# Altium footprint library mmyLibrary.PcbLib: 231 footprints (part 7 of 15)
Each footprint in its own frame and in the unit in brackets; x right, y up, seen from the top. Pads: shape width x height; smd on the part's side, far side on the other; paste and mask are expansions set on the pad; w line width, h text height; cw(c..) or ccw(c..) is an arc to the next point about the centre after c.
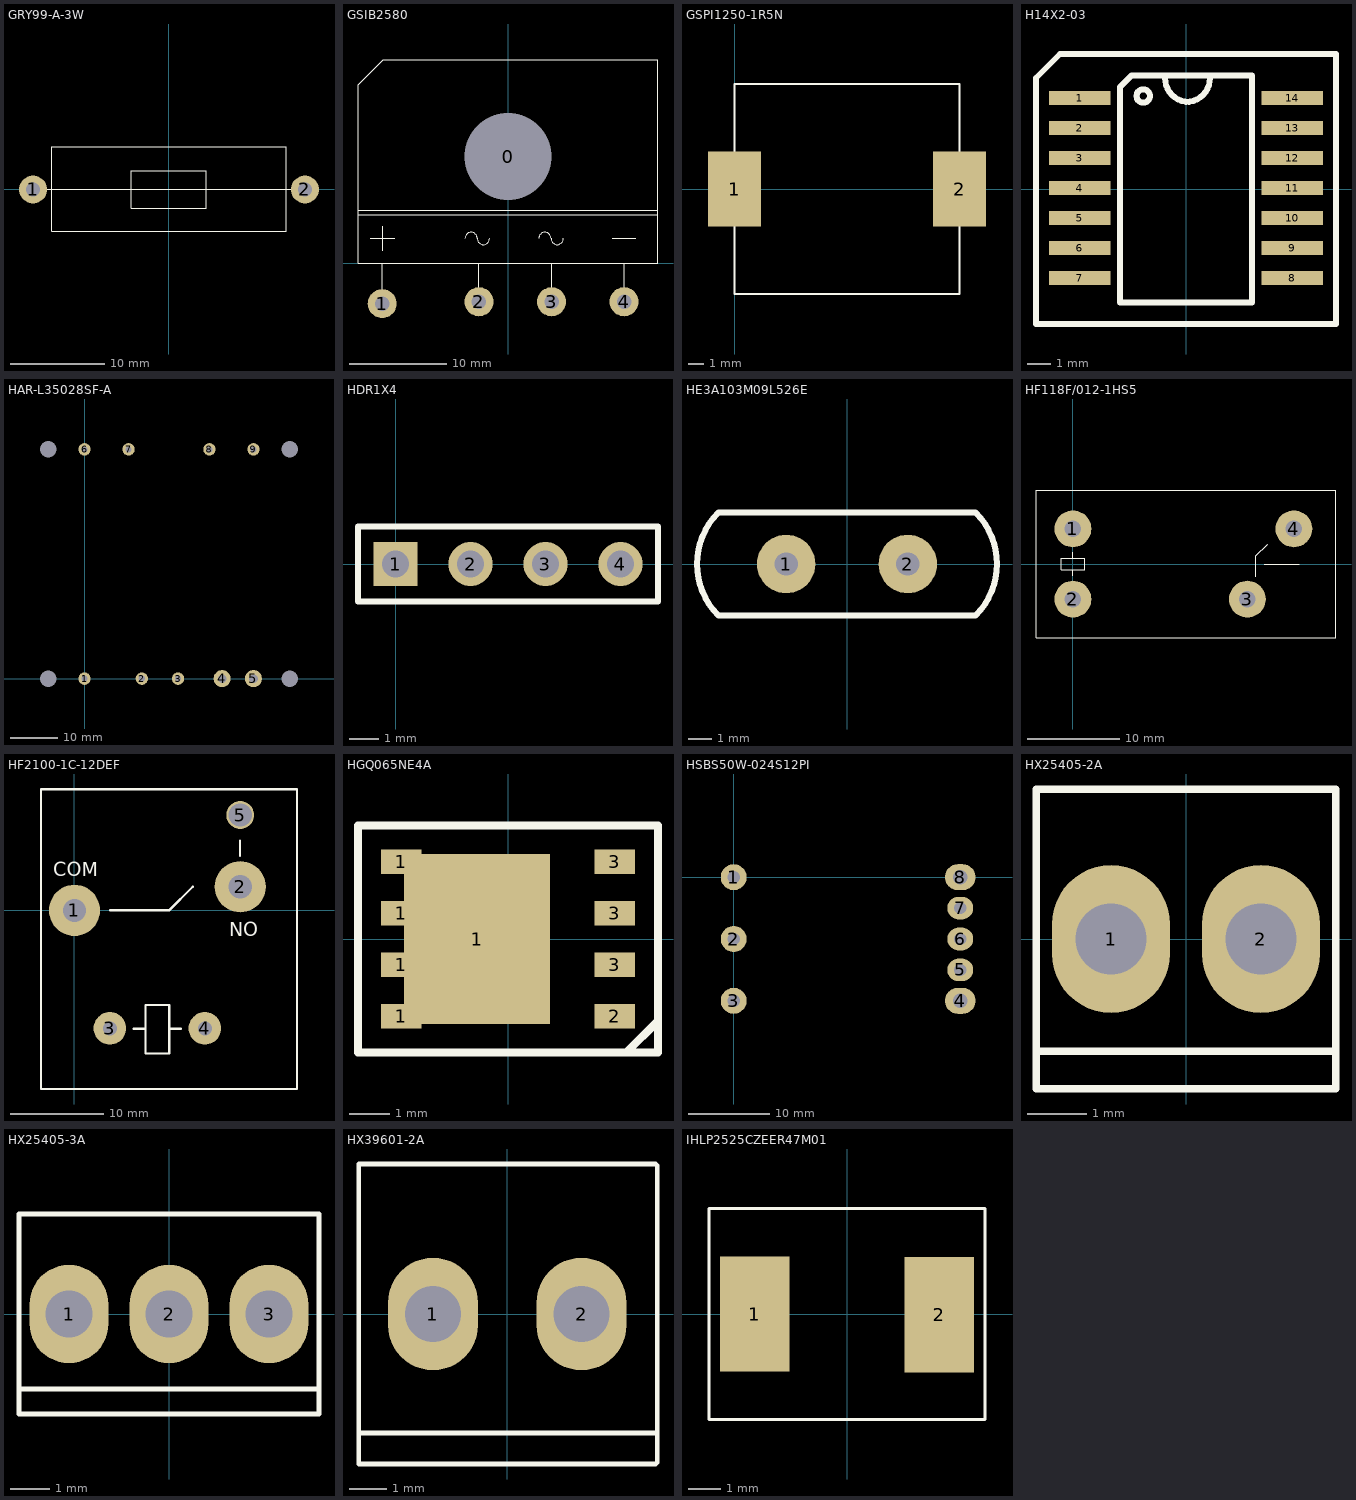
[diagram p6: the footprints below, top view; thin cyan lines are the x and y axes]

## GRY99-A-3W [mm]
pads (2):
  round 3 hole 1.5: 1(-14.5,0) 2(14.5,0)
Top Overlay:
  lines w0.127: -14,0 14,0 ; -12.5,-4.45 -12.5,4.55 12.5,4.55 12.5,-4.45 -12.5,-4.45 ; -4,-2 -4,2 4,2 4,-2 -4,-2

## GSIB2580 [mm]
pads (5):
  round 3 hole 9: 0(0,11)
  round 3 hole 1.5: 1(-13,-4.2) 2(-3,-4) 3(4.5,-4) 4(12,-4)
Top Overlay:
  lines w0.127: -15.5,5 15.5,5 ; -15.5,5.461 15.5,5.461 ; -14.224,2.54 -11.684,2.54 ; -13,-4.2 -13,0 ; -12.954,1.27 -12.954,3.81 ; -4.445,2.54 cw(c-3.81,2.54) -3.81,3.175 cw(c-3.81,2.54) -3.175,2.54 ccw(c-2.54,2.54) -2.54,1.905 ccw(c-2.54,2.54) -1.905,2.54 ; -3,-4 -3,0 ; 3.175,2.54 cw(c3.81,2.54) 3.81,3.175 cw(c3.81,2.54) 4.445,2.54 ccw(c5.08,2.54) 5.08,1.905 ccw(c5.08,2.54) 5.715,2.54 ; 4.5,-4 4.5,0 ; 10.795,2.54 13.208,2.54 ; 12,-4 12,0 ; -15.5,0 -15.5,18.409 -12.909,21 15.5,21 15.5,0 -15.5,0

## GSPI1250-1R5N [mm]
pads (2):
  rect 3.5x5 smd: 1(0,0) 2(15,0)
Top Overlay:
  lines w0.127: 0,-7 0,7 15,7 15,-7 0,-7

## H14X2-03 [mm]
pads (14):
  rect 2.6x0.6 smd: 1(-4.5,3.85) 2(-4.5,2.58) 3(-4.5,1.31) 4(-4.5,0.04) 5(-4.5,-1.23) 6(-4.5,-2.5) 7(-4.5,-3.77) 8(4.5,-3.77) 9(4.5,-2.5) 10(4.5,-1.23) 11(4.5,0.04) 12(4.5,1.31) 13(4.5,2.58) 14(4.5,3.85)
Top Overlay:
  circle w0.254: c-1.808,3.937 r0.284
  lines w0.254: -0.889,4.699 ccw(c0.127,4.699) 0.127,3.683 ; 0,3.683 ccw(c0,4.699) 1.016,4.699 ; -6.35,-5.715 -6.35,4.699 -5.334,5.715 6.35,5.715 6.35,-5.715 -6.35,-5.715 ; -2.8,-4.8 -2.8,4.312 -2.312,4.8 2.8,4.8 2.8,-4.8 -2.8,-4.8

## HAR-L35028SF-A [mm] "标准半砖模块"
height 12.7
pads (13):
  round 0 hole 3.5: 0(-7.62,0) 0(-7.62,48.26) 0(43.18,0) 0(43.18,48.26)
  round 2.6 hole 1.3: 1(0,0) 2(12.06,0) 3(19.68,0) 6(0,48.26) 7(9.27,48.26) 8(26.29,48.26) 9(35.56,48.26)
  round 3.6 hole 1.8: 4(28.96,0) 5(35.56,0)
Bottom Overlay:
  lines w0.2: -13.79,-5.17 ccw(c-12.79,-5.17) -12.79,-6.17 48.35,-6.17 ccw(c48.35,-5.17) 49.35,-5.17 49.35,53.43 ccw(c48.35,53.43) 48.35,54.43 -12.79,54.43 ccw(c-12.79,53.43) -13.79,53.43 -13.79,-5.17
  text "L2/N" at 0.635,2.921 h1
  text "PFC ENA" at 12.7,2.921 h1
  text "L1" at 20.193,2.921 h1
  text "VOUT-" at 29.845,2.921 h1
  text "VOUT+" at 36.322,2.921 h1
  text "NC" at 0.75,42.53 h1
  text "AUX" at 9.75,41.03 h1
  text "HU-" at 27.15,41.33 h1
  text "HU+" at 36.05,41.53 h1

## HDR1X4 [mm]
pads (4):
  rect 1.5x1.5 hole 0.9: 1(0,0)
  round 1.5 hole 0.9: 2(2.54,0) 3(5.08,0) 4(7.62,0)
Top Overlay:
  lines w0.2: -1.27,-1.27 8.89,-1.27 8.89,1.27 -1.27,1.27 -1.27,-1.27
3D body "User Library-zl201-4_p2-54_l10-16_w2-54_h8-89.STEP": height 8.89, standoff -3.05, extent -1.27,-1.27 8.89,1.27

## HE3A103M09L526E [mm]
pads (2):
  round 2.5 hole 1: 1(-2.6,0) 2(2.6,0)
Top Overlay:
  lines w0.254: -5.5,-2.2 cw(c-3.3,0) -5.5,2.2 5.5,2.2 cw(c3.3,0) 5.5,-2.2 -5.5,-2.2

## HF118F/012-1HS5 [mm] "继电器/厦门宏发"
pads (4):
  round 4 hole 1.8: 1(0,3.81) 2(0,-3.81) 3(18.9,-3.81) 4(23.94,3.81)
Top Overlay:
  lines w0.127: 0,-1.27 0,-0.635 ; 0,0.635 0,1.27 ; 19.812,-1.397 19.812,0.762 19.812,0.889 21.082,2.159 ; 20.701,0 24.511,0 ; -4,-8 28.5,-8 28.5,8 -4,8 -4,-8 ; -1.27,-0.635 -1.27,0.635 1.27,0.635 1.27,-0.635 -1.27,-0.635

## HF2100-1C-12DEF [mm] "L32.2*W27.5*H28mm，厦门宏发继电器"
height 28
pads (5):
  round 5.5 hole 2.5: 1(0,0) 2(17.8,2.54)
  round 3.5 hole 1.5: 3(3.8,-12.66) 4(14,-12.66)
  round 3 hole 2.5: 5(17.8,10.24)
Top Overlay:
  lines w0.254: 3.81,0 10.16,0 12.7,2.54 ; 6.35,-12.7 7.62,-12.7 ; 10.16,-12.7 11.43,-12.7 ; 17.78,5.842 17.78,7.493 ; 23.88,13.02 23.9,13.04 ; 23.88,13.02 23.9,13.04 ; 23.88,13.02 -3.6,13.02 -3.6,-19.16 23.89,-19.18 ; 23.89,-19.18 23.9,13.04 ; 23.89,-19.18 23.9,13.04 ; 7.62,-15.367 7.62,-10.16 10.16,-10.16 10.16,-15.367 7.62,-15.367
  text "COM" at -2.286,3.683 h1.5
  text "NO" at 16.637,-2.794 h1.5

## HGQ065NE4A [mm] "MOS"
pads (9):
  rect 1x0.6 smd: 1(-2.637,-1.905) 1(-2.637,-0.635) 1(-2.637,0.635) 1(-2.637,1.905) 2(2.637,-1.905) 3(2.637,-0.635) 3(2.637,0.635) 3(2.637,1.905)
  rect 3.6x4.2 smd: 1(-0.762,0)
Top Overlay:
  lines w0.2: 2.921,-2.794 3.683,-2.032 ; -3.7,-2.8 -3.7,2.8 3.7,2.8 3.7,-2.8 -3.7,-2.8

## HSBS50W-024S12PI [mm]
pads (8):
  round 3.2 hole 1.5: 1(0,0) 2(0,-7.62) 3(0,-15.24)
  oval 3.8x3.2 hole 1.8: 4(27.94,-15.24) 8(27.94,0)
  oval 3.2x2.8 hole 1.5: 5(27.94,-11.43) 6(27.94,-7.62) 7(27.94,-3.81)
Bottom Overlay:
  lines w0.254: -4.53,-21.12 -4.53,5.88 32.47,5.88 32.47,-21.12 -4.53,-21.12
  text "1" at 2.794,-0.635 h2
  text "2" at 2.794,-8.001 h2
  text "3" at 2.794,-15.875 h2
  text "4" at 25.4,-15.875 h2
  text "5" at 25.4,-12.065 h2
  text "6" at 25.4,-8.255 h2
  text "7" at 25.4,-4.445 h2
  text "8" at 25.4,-0.762 h2
  text "VIN-" at 6.985,-0.635 h2
  text "RC" at 6.35,-8.001 h2
  text "VIN+" at 7.239,-15.875 h2
  text "VOUT+" at 24.13,-15.875 h2
  text "+S" at 22.987,-12.065 h2
  text "TRIM" at 24.13,-8.255 h2
  text "-S" at 22.987,-4.445 h2
  text "VOUT-" at 24.13,-0.762 h2

## HX25003-3A [mm]

## HX25405-2A [mm] "5.08*直径0.9mm/浙江乐清/直针"
height 15
pads (2):
  oval 2x2.5 hole 1.2: 1(-1.27,0) 2(1.27,0)
Top Overlay:
  lines w0.127: -2.54,-1.905 2.54,-1.905 ; -2.54,-2.54 2.54,-2.54 2.54,2.54 -2.54,2.54 -2.54,-2.54

## HX25405-3A [mm] "7.62*直径0.9mm/浙江乐清/直针"
height 15
pads (3):
  oval 2x2.5 hole 1.2: 1(-2.54,0) 2(0,0) 3(2.54,0)
Top Overlay:
  lines w0.127: -3.81,-1.905 3.81,-1.905 ; -3.81,-2.54 3.81,-2.54 3.81,2.54 -3.81,2.54 -3.81,-2.54

## HX39601-2A [mm] "3.96*直径1.14mm/浙江乐清/直针"
height 15
pads (2):
  oval 2.4x3 hole 1.5: 1(-1.98,0) 2(1.98,0)
Top Overlay:
  lines w0.127: -3.937,-3.175 3.937,-3.175 ; 3.96,-4 -3.96,-4 -3.96,4 3.96,4 ; 4,-3.96 4,3.96

## IHLP2525CZEER47M01 [mil]
pads (2):
  rect 84x140 smd: 1(-112,0.5) 2(112,-0.5)
Top Overlay:
  lines w3.94: -166.72,127.85 -167.32,128.45 ; -167.32,128.45 108.27,128.45 167.32,128.45 167.32,-127.45 -167.32,-127.45 -167.32,128.45